# Altium schematic symbol library jlcpcb_2025_04_resistors_extended_1210.schlib: 2670 symbols (part 8 of 14) (continued)
## CR1210J91R0P05Z
designator R?  Resistance: 91Ω  (hidden comment: *)
Resistor, 91Ω, ±5%, 500mW, 200V, ±100ppm/℃, -55℃~+155℃, SMD 1210; Manufacturer: Uniroyal; Manufacturer Part Number: CR1210J91R0P05Z; Supplier 1: LCSC; Supplier Part Number 1: C174605; JLCPCB Part Number: C174605; Power Rating: 500mW; Category: Resistors; Package Size: 1210; JLCPCB Basic Part: Yes; Tolerance: ±5%; Voltage Rating: 200V; Temperature Coefficient: ±100ppm/℃; Temperature Rating: -55℃~+155℃; ComponentLink1Description: Datasheet; ComponentLink1URL: https://wmsc.lcsc.com/wmsc/upload/file/pdf/v2/lcsc/2304140030_Ever-Ohms-Tech-CR1210J91R0P05Z_C174605.pdf; ComponentLink2Description: JLCPCB Part URL; ComponentLink2URL: https://jlcpcb.com/partdetail/C174605
pins: 1, 2
1 alternate drawing of the same symbol

## CR1210J100KP05Z
designator R?  Resistance: 100kΩ  (hidden comment: *)
Resistor, 100kΩ, ±5%, 500mW, 200V, ±100ppm/℃, -55℃~+155℃, SMD 1210; Manufacturer: Uniroyal; Manufacturer Part Number: CR1210J100KP05Z; Supplier 1: LCSC; Supplier Part Number 1: C149727; JLCPCB Part Number: C149727; Power Rating: 500mW; Category: Resistors; Package Size: 1210; JLCPCB Basic Part: Yes; Tolerance: ±5%; Voltage Rating: 200V; Temperature Coefficient: ±100ppm/℃; Temperature Rating: -55℃~+155℃; ComponentLink1Description: Datasheet; ComponentLink1URL: https://wmsc.lcsc.com/wmsc/upload/file/pdf/v2/lcsc/2304140030_Ever-Ohms-Tech-CR1210J100KP05Z_C149727.pdf; ComponentLink2Description: JLCPCB Part URL; ComponentLink2URL: https://jlcpcb.com/partdetail/C149727
pins: 1, 2
1 alternate drawing of the same symbol

## CR1210J100RP05Z
designator R?  Resistance: 100Ω  (hidden comment: *)
Resistor, 100Ω, ±5%, 500mW, 200V, ±100ppm/℃, -55℃~+155℃, SMD 1210; Manufacturer: Uniroyal; Manufacturer Part Number: CR1210J100RP05Z; Supplier 1: LCSC; Supplier Part Number 1: C174606; JLCPCB Part Number: C174606; Power Rating: 500mW; Category: Resistors; Package Size: 1210; JLCPCB Basic Part: Yes; Tolerance: ±5%; Voltage Rating: 200V; Temperature Coefficient: ±100ppm/℃; Temperature Rating: -55℃~+155℃; ComponentLink1Description: Datasheet; ComponentLink1URL: https://wmsc.lcsc.com/wmsc/upload/file/pdf/v2/lcsc/2304140030_Ever-Ohms-Tech-CR1210J100RP05Z_C174606.pdf; ComponentLink2Description: JLCPCB Part URL; ComponentLink2URL: https://jlcpcb.com/partdetail/C174606
pins: 1, 2
1 alternate drawing of the same symbol

## CR1210J110KP05Z
designator R?  Resistance: 110kΩ  (hidden comment: *)
Resistor, 110kΩ, ±5%, 500mW, 200V, ±100ppm/℃, -55℃~+155℃, SMD 1210; Manufacturer: Uniroyal; Manufacturer Part Number: CR1210J110KP05Z; Supplier 1: LCSC; Supplier Part Number 1: C174659; JLCPCB Part Number: C174659; Power Rating: 500mW; Category: Resistors; Package Size: 1210; JLCPCB Basic Part: Yes; Tolerance: ±5%; Voltage Rating: 200V; Temperature Coefficient: ±100ppm/℃; Temperature Rating: -55℃~+155℃; ComponentLink1Description: Datasheet; ComponentLink1URL: https://wmsc.lcsc.com/wmsc/upload/file/pdf/v2/lcsc/2304140030_Ever-Ohms-Tech-CR1210J110KP05Z_C174659.pdf; ComponentLink2Description: JLCPCB Part URL; ComponentLink2URL: https://jlcpcb.com/partdetail/C174659
pins: 1, 2
1 alternate drawing of the same symbol

## CR1210J120KP05Z
designator R?  Resistance: 120kΩ  (hidden comment: *)
Resistor, 120kΩ, ±5%, 500mW, 200V, ±100ppm/℃, -55℃~+155℃, SMD 1210; Manufacturer: Uniroyal; Manufacturer Part Number: CR1210J120KP05Z; Supplier 1: LCSC; Supplier Part Number 1: C149731; JLCPCB Part Number: C149731; Power Rating: 500mW; Category: Resistors; Package Size: 1210; JLCPCB Basic Part: Yes; Tolerance: ±5%; Voltage Rating: 200V; Temperature Coefficient: ±100ppm/℃; Temperature Rating: -55℃~+155℃; ComponentLink1Description: Datasheet; ComponentLink1URL: https://wmsc.lcsc.com/wmsc/upload/file/pdf/v2/lcsc/2304140030_Ever-Ohms-Tech-CR1210J120KP05Z_C149731.pdf; ComponentLink2Description: JLCPCB Part URL; ComponentLink2URL: https://jlcpcb.com/partdetail/C149731
pins: 1, 2
1 alternate drawing of the same symbol

## CR1210J120RP05Z
designator R?  Resistance: 120Ω  (hidden comment: *)
Resistor, 120Ω, ±5%, 500mW, 200V, ±100ppm/℃, -55℃~+155℃, SMD 1210; Manufacturer: Uniroyal; Manufacturer Part Number: CR1210J120RP05Z; Supplier 1: LCSC; Supplier Part Number 1: C174609; JLCPCB Part Number: C174609; Power Rating: 500mW; Category: Resistors; Package Size: 1210; JLCPCB Basic Part: Yes; Tolerance: ±5%; Voltage Rating: 200V; Temperature Coefficient: ±100ppm/℃; Temperature Rating: -55℃~+155℃; ComponentLink1Description: Datasheet; ComponentLink1URL: https://wmsc.lcsc.com/wmsc/upload/file/pdf/v2/lcsc/2304140030_Ever-Ohms-Tech-CR1210J120RP05Z_C174609.pdf; ComponentLink2Description: JLCPCB Part URL; ComponentLink2URL: https://jlcpcb.com/partdetail/C174609
pins: 1, 2
1 alternate drawing of the same symbol

## CR1210J150KP05Z
designator R?  Resistance: 150kΩ  (hidden comment: *)
Resistor, 150kΩ, ±5%, 500mW, 200V, ±100ppm/℃, -55℃~+155℃, SMD 1210; Manufacturer: Uniroyal; Manufacturer Part Number: CR1210J150KP05Z; Supplier 1: LCSC; Supplier Part Number 1: C174661; JLCPCB Part Number: C174661; Power Rating: 500mW; Category: Resistors; Package Size: 1210; JLCPCB Basic Part: Yes; Tolerance: ±5%; Voltage Rating: 200V; Temperature Coefficient: ±100ppm/℃; Temperature Rating: -55℃~+155℃; ComponentLink1Description: Datasheet; ComponentLink1URL: https://wmsc.lcsc.com/wmsc/upload/file/pdf/v2/lcsc/2304140030_Ever-Ohms-Tech-CR1210J150KP05Z_C174661.pdf; ComponentLink2Description: JLCPCB Part URL; ComponentLink2URL: https://jlcpcb.com/partdetail/C174661
pins: 1, 2
1 alternate drawing of the same symbol

## CR1210J160KP05Z
designator R?  Resistance: 160kΩ  (hidden comment: *)
Resistor, 160kΩ, ±5%, 500mW, 200V, ±100ppm/℃, -55℃~+155℃, SMD 1210; Manufacturer: Uniroyal; Manufacturer Part Number: CR1210J160KP05Z; Supplier 1: LCSC; Supplier Part Number 1: C174662; JLCPCB Part Number: C174662; Power Rating: 500mW; Category: Resistors; Package Size: 1210; JLCPCB Basic Part: Yes; Tolerance: ±5%; Voltage Rating: 200V; Temperature Coefficient: ±100ppm/℃; Temperature Rating: -55℃~+155℃; ComponentLink1Description: Datasheet; ComponentLink1URL: https://wmsc.lcsc.com/wmsc/upload/file/pdf/v2/lcsc/2304140030_Ever-Ohms-Tech-CR1210J160KP05Z_C174662.pdf; ComponentLink2Description: JLCPCB Part URL; ComponentLink2URL: https://jlcpcb.com/partdetail/C174662
pins: 1, 2
1 alternate drawing of the same symbol

## CR1210J160RP05Z
designator R?  Resistance: 160Ω  (hidden comment: *)
Resistor, 160Ω, ±5%, 500mW, 200V, ±100ppm/℃, -55℃~+155℃, SMD 1210; Manufacturer: Uniroyal; Manufacturer Part Number: CR1210J160RP05Z; Supplier 1: LCSC; Supplier Part Number 1: C174612; JLCPCB Part Number: C174612; Power Rating: 500mW; Category: Resistors; Package Size: 1210; JLCPCB Basic Part: Yes; Tolerance: ±5%; Voltage Rating: 200V; Temperature Coefficient: ±100ppm/℃; Temperature Rating: -55℃~+155℃; ComponentLink1Description: Datasheet; ComponentLink1URL: https://wmsc.lcsc.com/wmsc/upload/file/pdf/v2/lcsc/2304140030_Ever-Ohms-Tech-CR1210J160RP05Z_C174612.pdf; ComponentLink2Description: JLCPCB Part URL; ComponentLink2URL: https://jlcpcb.com/partdetail/C174612
pins: 1, 2
1 alternate drawing of the same symbol

## CR1210J180KP05Z
designator R?  Resistance: 180kΩ  (hidden comment: *)
Resistor, 180kΩ, ±5%, 500mW, 200V, ±100ppm/℃, -55℃~+155℃, SMD 1210; Manufacturer: Uniroyal; Manufacturer Part Number: CR1210J180KP05Z; Supplier 1: LCSC; Supplier Part Number 1: C149736; JLCPCB Part Number: C149736; Power Rating: 500mW; Category: Resistors; Package Size: 1210; JLCPCB Basic Part: Yes; Tolerance: ±5%; Voltage Rating: 200V; Temperature Coefficient: ±100ppm/℃; Temperature Rating: -55℃~+155℃; ComponentLink1Description: Datasheet; ComponentLink1URL: https://wmsc.lcsc.com/wmsc/upload/file/pdf/v2/lcsc/2304140030_Ever-Ohms-Tech-CR1210J180KP05Z_C149736.pdf; ComponentLink2Description: JLCPCB Part URL; ComponentLink2URL: https://jlcpcb.com/partdetail/C149736
pins: 1, 2
1 alternate drawing of the same symbol

## CR1210J180RP05Z
designator R?  Resistance: 180Ω  (hidden comment: *)
Resistor, 180Ω, ±5%, 500mW, 200V, ±100ppm/℃, -55℃~+155℃, SMD 1210; Manufacturer: Uniroyal; Manufacturer Part Number: CR1210J180RP05Z; Supplier 1: LCSC; Supplier Part Number 1: C149737; JLCPCB Part Number: C149737; Power Rating: 500mW; Category: Resistors; Package Size: 1210; JLCPCB Basic Part: Yes; Tolerance: ±5%; Voltage Rating: 200V; Temperature Coefficient: ±100ppm/℃; Temperature Rating: -55℃~+155℃; ComponentLink1Description: Datasheet; ComponentLink1URL: https://wmsc.lcsc.com/wmsc/upload/file/pdf/v2/lcsc/2304140030_Ever-Ohms-Tech-CR1210J180RP05Z_C149737.pdf; ComponentLink2Description: JLCPCB Part URL; ComponentLink2URL: https://jlcpcb.com/partdetail/C149737
pins: 1, 2
1 alternate drawing of the same symbol

## CR1210J200KP05Z
designator R?  Resistance: 200kΩ  (hidden comment: *)
Resistor, 200kΩ, ±5%, 500mW, 200V, ±100ppm/℃, -55℃~+155℃, SMD 1210; Manufacturer: Uniroyal; Manufacturer Part Number: CR1210J200KP05Z; Supplier 1: LCSC; Supplier Part Number 1: C174664; JLCPCB Part Number: C174664; Power Rating: 500mW; Category: Resistors; Package Size: 1210; JLCPCB Basic Part: Yes; Tolerance: ±5%; Voltage Rating: 200V; Temperature Coefficient: ±100ppm/℃; Temperature Rating: -55℃~+155℃; ComponentLink1Description: Datasheet; ComponentLink1URL: https://wmsc.lcsc.com/wmsc/upload/file/pdf/v2/lcsc/2304140030_Ever-Ohms-Tech-CR1210J200KP05Z_C174664.pdf; ComponentLink2Description: JLCPCB Part URL; ComponentLink2URL: https://jlcpcb.com/partdetail/C174664
pins: 1, 2
1 alternate drawing of the same symbol

## CR1210J200RP05Z
designator R?  Resistance: 200Ω  (hidden comment: *)
Resistor, 200Ω, ±5%, 500mW, 200V, ±100ppm/℃, -55℃~+155℃, SMD 1210; Manufacturer: Uniroyal; Manufacturer Part Number: CR1210J200RP05Z; Supplier 1: LCSC; Supplier Part Number 1: C174613; JLCPCB Part Number: C174613; Power Rating: 500mW; Category: Resistors; Package Size: 1210; JLCPCB Basic Part: Yes; Tolerance: ±5%; Voltage Rating: 200V; Temperature Coefficient: ±100ppm/℃; Temperature Rating: -55℃~+155℃; ComponentLink1Description: Datasheet; ComponentLink1URL: https://wmsc.lcsc.com/wmsc/upload/file/pdf/v2/lcsc/2304140030_Ever-Ohms-Tech-CR1210J200RP05Z_C174613.pdf; ComponentLink2Description: JLCPCB Part URL; ComponentLink2URL: https://jlcpcb.com/partdetail/C174613
pins: 1, 2
1 alternate drawing of the same symbol

## CR1210J220KP05Z
designator R?  Resistance: 220kΩ  (hidden comment: *)
Resistor, 220kΩ, ±5%, 500mW, 200V, ±100ppm/℃, -55℃~+155℃, SMD 1210; Manufacturer: Uniroyal; Manufacturer Part Number: CR1210J220KP05Z; Supplier 1: LCSC; Supplier Part Number 1: C149753; JLCPCB Part Number: C149753; Power Rating: 500mW; Category: Resistors; Package Size: 1210; JLCPCB Basic Part: Yes; Tolerance: ±5%; Voltage Rating: 200V; Temperature Coefficient: ±100ppm/℃; Temperature Rating: -55℃~+155℃; ComponentLink1Description: Datasheet; ComponentLink1URL: https://wmsc.lcsc.com/wmsc/upload/file/pdf/v2/lcsc/2304140030_Ever-Ohms-Tech-CR1210J220KP05Z_C149753.pdf; ComponentLink2Description: JLCPCB Part URL; ComponentLink2URL: https://jlcpcb.com/partdetail/C149753
pins: 1, 2
1 alternate drawing of the same symbol

## CR1210J220RP05Z
designator R?  Resistance: 220Ω  (hidden comment: *)
Resistor, 220Ω, ±5%, 500mW, 200V, ±100ppm/℃, -55℃~+155℃, SMD 1210; Manufacturer: Uniroyal; Manufacturer Part Number: CR1210J220RP05Z; Supplier 1: LCSC; Supplier Part Number 1: C149754; JLCPCB Part Number: C149754; Power Rating: 500mW; Category: Resistors; Package Size: 1210; JLCPCB Basic Part: Yes; Tolerance: ±5%; Voltage Rating: 200V; Temperature Coefficient: ±100ppm/℃; Temperature Rating: -55℃~+155℃; ComponentLink1Description: Datasheet; ComponentLink1URL: https://wmsc.lcsc.com/wmsc/upload/file/pdf/v2/lcsc/2304140030_Ever-Ohms-Tech-CR1210J220RP05Z_C149754.pdf; ComponentLink2Description: JLCPCB Part URL; ComponentLink2URL: https://jlcpcb.com/partdetail/C149754
pins: 1, 2
1 alternate drawing of the same symbol

## CR1210J240RP05Z
designator R?  Resistance: 240Ω  (hidden comment: *)
Resistor, 240Ω, ±5%, 500mW, 200V, ±100ppm/℃, -55℃~+155℃, SMD 1210; Manufacturer: Uniroyal; Manufacturer Part Number: CR1210J240RP05Z; Supplier 1: LCSC; Supplier Part Number 1: C149756; JLCPCB Part Number: C149756; Power Rating: 500mW; Category: Resistors; Package Size: 1210; JLCPCB Basic Part: Yes; Tolerance: ±5%; Voltage Rating: 200V; Temperature Coefficient: ±100ppm/℃; Temperature Rating: -55℃~+155℃; ComponentLink1Description: Datasheet; ComponentLink1URL: https://wmsc.lcsc.com/wmsc/upload/file/pdf/v2/lcsc/2304140030_Ever-Ohms-Tech-CR1210J240RP05Z_C149756.pdf; ComponentLink2Description: JLCPCB Part URL; ComponentLink2URL: https://jlcpcb.com/partdetail/C149756
pins: 1, 2
1 alternate drawing of the same symbol

## CR1210J270RP05Z
designator R?  Resistance: 270Ω  (hidden comment: *)
Resistor, 270Ω, ±5%, 500mW, 200V, ±100ppm/℃, -55℃~+155℃, SMD 1210; Manufacturer: Uniroyal; Manufacturer Part Number: CR1210J270RP05Z; Supplier 1: LCSC; Supplier Part Number 1: C149759; JLCPCB Part Number: C149759; Power Rating: 500mW; Category: Resistors; Package Size: 1210; JLCPCB Basic Part: Yes; Tolerance: ±5%; Voltage Rating: 200V; Temperature Coefficient: ±100ppm/℃; Temperature Rating: -55℃~+155℃; ComponentLink1Description: Datasheet; ComponentLink1URL: https://wmsc.lcsc.com/wmsc/upload/file/pdf/v2/lcsc/2304140030_Ever-Ohms-Tech-CR1210J270RP05Z_C149759.pdf; ComponentLink2Description: JLCPCB Part URL; ComponentLink2URL: https://jlcpcb.com/partdetail/C149759
pins: 1, 2
1 alternate drawing of the same symbol

## CR1210J300RP05Z
designator R?  Resistance: 300Ω  (hidden comment: *)
Resistor, 300Ω, ±5%, 500mW, 200V, ±100ppm/℃, -55℃~+155℃, SMD 1210; Manufacturer: Uniroyal; Manufacturer Part Number: CR1210J300RP05Z; Supplier 1: LCSC; Supplier Part Number 1: C174614; JLCPCB Part Number: C174614; Power Rating: 500mW; Category: Resistors; Package Size: 1210; JLCPCB Basic Part: Yes; Tolerance: ±5%; Voltage Rating: 200V; Temperature Coefficient: ±100ppm/℃; Temperature Rating: -55℃~+155℃; ComponentLink1Description: Datasheet; ComponentLink1URL: https://wmsc.lcsc.com/wmsc/upload/file/pdf/v2/lcsc/2304140030_Ever-Ohms-Tech-CR1210J300RP05Z_C174614.pdf; ComponentLink2Description: JLCPCB Part URL; ComponentLink2URL: https://jlcpcb.com/partdetail/C174614
pins: 1, 2
1 alternate drawing of the same symbol

## CR1210J301R2G
designator R?  Resistance: 1.2Ω  (hidden comment: *)
Resistor, 1.2Ω, ±5%, 750mW, 200V, -250ppm/℃~+500ppm/℃, -55℃~+125℃, SMD 1210; Manufacturer: Uniroyal; Manufacturer Part Number: CR1210J301R2G; Supplier 1: LCSC; Supplier Part Number 1: C102422; JLCPCB Part Number: C102422; Power Rating: 750mW; Category: Resistors; Package Size: 1210; JLCPCB Basic Part: Yes; Tolerance: ±5%; Voltage Rating: 200V; Temperature Coefficient: -250ppm/℃~+500ppm/℃; Temperature Rating: -55℃~+125℃; ComponentLink1Description: Datasheet; ComponentLink1URL: https://wmsc.lcsc.com/wmsc/upload/file/pdf/v2/lcsc/2304140030_LIZ-Elec-CR1210J301R2G_C102422.pdf; ComponentLink2Description: JLCPCB Part URL; ComponentLink2URL: https://jlcpcb.com/partdetail/C102422
pins: 1, 2
1 alternate drawing of the same symbol

## CR1210J301R5G
designator R?  Resistance: 1.5Ω  (hidden comment: *)
Resistor, 1.5Ω, ±5%, 750mW, 200V, -250ppm/℃~+500ppm/℃, -55℃~+125℃, SMD 1210; Manufacturer: Uniroyal; Manufacturer Part Number: CR1210J301R5G; Supplier 1: LCSC; Supplier Part Number 1: C102423; JLCPCB Part Number: C102423; Power Rating: 750mW; Category: Resistors; Package Size: 1210; JLCPCB Basic Part: Yes; Tolerance: ±5%; Voltage Rating: 200V; Temperature Coefficient: -250ppm/℃~+500ppm/℃; Temperature Rating: -55℃~+125℃; ComponentLink1Description: Datasheet; ComponentLink1URL: https://wmsc.lcsc.com/wmsc/upload/file/pdf/v2/lcsc/2304140030_LIZ-Elec-CR1210J301R5G_C102423.pdf; ComponentLink2Description: JLCPCB Part URL; ComponentLink2URL: https://jlcpcb.com/partdetail/C102423
pins: 1, 2
1 alternate drawing of the same symbol

## CR1210J301R6G
designator R?  Resistance: 1.6Ω  (hidden comment: *)
Resistor, 1.6Ω, ±5%, 750mW, 200V, -250ppm/℃~+500ppm/℃, -55℃~+125℃, SMD 1210; Manufacturer: Uniroyal; Manufacturer Part Number: CR1210J301R6G; Supplier 1: LCSC; Supplier Part Number 1: C102424; JLCPCB Part Number: C102424; Power Rating: 750mW; Category: Resistors; Package Size: 1210; JLCPCB Basic Part: Yes; Tolerance: ±5%; Voltage Rating: 200V; Temperature Coefficient: -250ppm/℃~+500ppm/℃; Temperature Rating: -55℃~+125℃; ComponentLink1Description: Datasheet; ComponentLink1URL: https://wmsc.lcsc.com/wmsc/upload/file/pdf/v2/lcsc/2304140030_LIZ-Elec-CR1210J301R6G_C102424.pdf; ComponentLink2Description: JLCPCB Part URL; ComponentLink2URL: https://jlcpcb.com/partdetail/C102424
pins: 1, 2
1 alternate drawing of the same symbol

## CR1210J301R8G
designator R?  Resistance: 1.8Ω  (hidden comment: *)
Resistor, 1.8Ω, ±5%, 750mW, 200V, -250ppm/℃~+500ppm/℃, -55℃~+125℃, SMD 1210; Manufacturer: Uniroyal; Manufacturer Part Number: CR1210J301R8G; Supplier 1: LCSC; Supplier Part Number 1: C102425; JLCPCB Part Number: C102425; Power Rating: 750mW; Category: Resistors; Package Size: 1210; JLCPCB Basic Part: Yes; Tolerance: ±5%; Voltage Rating: 200V; Temperature Coefficient: -250ppm/℃~+500ppm/℃; Temperature Rating: -55℃~+125℃; ComponentLink1Description: Datasheet; ComponentLink1URL: https://wmsc.lcsc.com/wmsc/upload/file/pdf/v2/lcsc/2304140030_LIZ-Elec-CR1210J301R8G_C102425.pdf; ComponentLink2Description: JLCPCB Part URL; ComponentLink2URL: https://jlcpcb.com/partdetail/C102425
pins: 1, 2
1 alternate drawing of the same symbol

## CR1210J302R0G
designator R?  Resistance: 2Ω  (hidden comment: *)
Resistor, 2Ω, ±5%, 750mW, 200V, -250ppm/℃~+500ppm/℃, -55℃~+125℃, SMD 1210; Manufacturer: Uniroyal; Manufacturer Part Number: CR1210J302R0G; Supplier 1: LCSC; Supplier Part Number 1: C102447; JLCPCB Part Number: C102447; Power Rating: 750mW; Category: Resistors; Package Size: 1210; JLCPCB Basic Part: Yes; Tolerance: ±5%; Voltage Rating: 200V; Temperature Coefficient: -250ppm/℃~+500ppm/℃; Temperature Rating: -55℃~+125℃; ComponentLink1Description: Datasheet; ComponentLink1URL: https://wmsc.lcsc.com/wmsc/upload/file/pdf/v2/lcsc/2304140030_LIZ-Elec-CR1210J302R0G_C102447.pdf; ComponentLink2Description: JLCPCB Part URL; ComponentLink2URL: https://jlcpcb.com/partdetail/C102447
pins: 1, 2
1 alternate drawing of the same symbol

## CR1210J302R2G
designator R?  Resistance: 2.2Ω  (hidden comment: *)
Resistor, 2.2Ω, ±5%, 750mW, 200V, -250ppm/℃~+500ppm/℃, -55℃~+125℃, SMD 1210; Manufacturer: Uniroyal; Manufacturer Part Number: CR1210J302R2G; Supplier 1: LCSC; Supplier Part Number 1: C102448; JLCPCB Part Number: C102448; Power Rating: 750mW; Category: Resistors; Package Size: 1210; JLCPCB Basic Part: Yes; Tolerance: ±5%; Voltage Rating: 200V; Temperature Coefficient: -250ppm/℃~+500ppm/℃; Temperature Rating: -55℃~+125℃; ComponentLink1Description: Datasheet; ComponentLink1URL: https://wmsc.lcsc.com/wmsc/upload/file/pdf/v2/lcsc/2304140030_LIZ-Elec-CR1210J302R2G_C102448.pdf; ComponentLink2Description: JLCPCB Part URL; ComponentLink2URL: https://jlcpcb.com/partdetail/C102448
pins: 1, 2
1 alternate drawing of the same symbol

## CR1210J303R3G
designator R?  Resistance: 3.3Ω  (hidden comment: *)
Resistor, 3.3Ω, ±5%, 750mW, 200V, -250ppm/℃~+500ppm/℃, -55℃~+125℃, SMD 1210; Manufacturer: Uniroyal; Manufacturer Part Number: CR1210J303R3G; Supplier 1: LCSC; Supplier Part Number 1: C102467; JLCPCB Part Number: C102467; Power Rating: 750mW; Category: Resistors; Package Size: 1210; JLCPCB Basic Part: Yes; Tolerance: ±5%; Voltage Rating: 200V; Temperature Coefficient: -250ppm/℃~+500ppm/℃; Temperature Rating: -55℃~+125℃; ComponentLink1Description: Datasheet; ComponentLink1URL: https://wmsc.lcsc.com/wmsc/upload/file/pdf/v2/lcsc/2304140030_LIZ-Elec-CR1210J303R3G_C102467.pdf; ComponentLink2Description: JLCPCB Part URL; ComponentLink2URL: https://jlcpcb.com/partdetail/C102467
pins: 1, 2
1 alternate drawing of the same symbol

## CR1210J303R6G
designator R?  Resistance: 3.6Ω  (hidden comment: *)
Resistor, 3.6Ω, ±5%, 200V, SMD 1210; Manufacturer: Uniroyal; Manufacturer Part Number: CR1210J303R6G; Supplier 1: LCSC; Supplier Part Number 1: C3037120; JLCPCB Part Number: C3037120; Category: Resistors; Package Size: 1210; JLCPCB Basic Part: Yes; Tolerance: ±5%; Voltage Rating: 200V; ComponentLink1Description: Datasheet; ComponentLink1URL: https://wmsc.lcsc.com/wmsc/upload/file/pdf/v2/lcsc/2206222045_LIZ-Elec-CR1210J303R6G_C3037120.pdf; ComponentLink2Description: JLCPCB Part URL; ComponentLink2URL: https://jlcpcb.com/partdetail/C3037120
pins: 1, 2
1 alternate drawing of the same symbol

## CR1210J304R3G
designator R?  Resistance: 4.3Ω  (hidden comment: *)
Resistor, 4.3Ω, ±5%, 750mW, 200V, -250ppm/℃~+500ppm/℃, -55℃~+125℃, SMD 1210; Manufacturer: Uniroyal; Manufacturer Part Number: CR1210J304R3G; Supplier 1: LCSC; Supplier Part Number 1: C102477; JLCPCB Part Number: C102477; Power Rating: 750mW; Category: Resistors; Package Size: 1210; JLCPCB Basic Part: Yes; Tolerance: ±5%; Voltage Rating: 200V; Temperature Coefficient: -250ppm/℃~+500ppm/℃; Temperature Rating: -55℃~+125℃; ComponentLink1Description: Datasheet; ComponentLink1URL: https://wmsc.lcsc.com/wmsc/upload/file/pdf/v2/lcsc/2304140030_LIZ-Elec-CR1210J304R3G_C102477.pdf; ComponentLink2Description: JLCPCB Part URL; ComponentLink2URL: https://jlcpcb.com/partdetail/C102477
pins: 1, 2
1 alternate drawing of the same symbol

## CR1210J307R5G
designator R?  Resistance: 7.5Ω  (hidden comment: *)
Resistor, 7.5Ω, ±5%, 750mW, 200V, -250ppm/℃~+500ppm/℃, -55℃~+125℃, SMD 1210; Manufacturer: Uniroyal; Manufacturer Part Number: CR1210J307R5G; Supplier 1: LCSC; Supplier Part Number 1: C102501; JLCPCB Part Number: C102501; Power Rating: 750mW; Category: Resistors; Package Size: 1210; JLCPCB Basic Part: Yes; Tolerance: ±5%; Voltage Rating: 200V; Temperature Coefficient: -250ppm/℃~+500ppm/℃; Temperature Rating: -55℃~+125℃; ComponentLink1Description: Datasheet; ComponentLink1URL: https://wmsc.lcsc.com/wmsc/upload/file/pdf/v2/lcsc/2304140030_LIZ-Elec-CR1210J307R5G_C102501.pdf; ComponentLink2Description: JLCPCB Part URL; ComponentLink2URL: https://jlcpcb.com/partdetail/C102501
pins: 1, 2
1 alternate drawing of the same symbol

## CR1210J309R1G
designator R?  Resistance: 9.1Ω  (hidden comment: *)
Resistor, 9.1Ω, ±5%, 200V, SMD 1210; Manufacturer: Uniroyal; Manufacturer Part Number: CR1210J309R1G; Supplier 1: LCSC; Supplier Part Number 1: C3037412; JLCPCB Part Number: C3037412; Category: Resistors; Package Size: 1210; JLCPCB Basic Part: Yes; Tolerance: ±5%; Voltage Rating: 200V; ComponentLink1Description: Datasheet; ComponentLink1URL: https://wmsc.lcsc.com/wmsc/upload/file/pdf/v2/lcsc/2206222045_LIZ-Elec-CR1210J309R1G_C3037412.pdf; ComponentLink2Description: JLCPCB Part URL; ComponentLink2URL: https://jlcpcb.com/partdetail/C3037412
pins: 1, 2
1 alternate drawing of the same symbol

## CR1210J330KP05Z
designator R?  Resistance: 330kΩ  (hidden comment: *)
Resistor, 330kΩ, ±5%, 500mW, 200V, ±100ppm/℃, -55℃~+155℃, SMD 1210; Manufacturer: Uniroyal; Manufacturer Part Number: CR1210J330KP05Z; Supplier 1: LCSC; Supplier Part Number 1: C149770; JLCPCB Part Number: C149770; Power Rating: 500mW; Category: Resistors; Package Size: 1210; JLCPCB Basic Part: Yes; Tolerance: ±5%; Voltage Rating: 200V; Temperature Coefficient: ±100ppm/℃; Temperature Rating: -55℃~+155℃; ComponentLink1Description: Datasheet; ComponentLink1URL: https://wmsc.lcsc.com/wmsc/upload/file/pdf/v2/lcsc/2304140030_Ever-Ohms-Tech-CR1210J330KP05Z_C149770.pdf; ComponentLink2Description: JLCPCB Part URL; ComponentLink2URL: https://jlcpcb.com/partdetail/C149770
pins: 1, 2
1 alternate drawing of the same symbol

## CR1210J330RP05Z
designator R?  Resistance: 330Ω  (hidden comment: *)
Resistor, 330Ω, ±5%, 500mW, 200V, ±100ppm/℃, -55℃~+155℃, SMD 1210; Manufacturer: Uniroyal; Manufacturer Part Number: CR1210J330RP05Z; Supplier 1: LCSC; Supplier Part Number 1: C149771; JLCPCB Part Number: C149771; Power Rating: 500mW; Category: Resistors; Package Size: 1210; JLCPCB Basic Part: Yes; Tolerance: ±5%; Voltage Rating: 200V; Temperature Coefficient: ±100ppm/℃; Temperature Rating: -55℃~+155℃; ComponentLink1Description: Datasheet; ComponentLink1URL: https://wmsc.lcsc.com/wmsc/upload/file/pdf/v2/lcsc/2304140030_Ever-Ohms-Tech-CR1210J330RP05Z_C149771.pdf; ComponentLink2Description: JLCPCB Part URL; ComponentLink2URL: https://jlcpcb.com/partdetail/C149771
pins: 1, 2
1 alternate drawing of the same symbol

## CR1210J360KP05Z
designator R?  Resistance: 360kΩ  (hidden comment: *)
Resistor, 360kΩ, ±5%, 500mW, 200V, ±100ppm/℃, -55℃~+155℃, SMD 1210; Manufacturer: Uniroyal; Manufacturer Part Number: CR1210J360KP05Z; Supplier 1: LCSC; Supplier Part Number 1: C149774; JLCPCB Part Number: C149774; Power Rating: 500mW; Category: Resistors; Package Size: 1210; JLCPCB Basic Part: Yes; Tolerance: ±5%; Voltage Rating: 200V; Temperature Coefficient: ±100ppm/℃; Temperature Rating: -55℃~+155℃; ComponentLink1Description: Datasheet; ComponentLink1URL: https://wmsc.lcsc.com/wmsc/upload/file/pdf/v2/lcsc/2304140030_Ever-Ohms-Tech-CR1210J360KP05Z_C149774.pdf; ComponentLink2Description: JLCPCB Part URL; ComponentLink2URL: https://jlcpcb.com/partdetail/C149774
pins: 1, 2
1 alternate drawing of the same symbol

## CR1210J390RP05Z
designator R?  Resistance: 390Ω  (hidden comment: *)
Resistor, 390Ω, ±5%, 500mW, 200V, ±100ppm/℃, -55℃~+155℃, SMD 1210; Manufacturer: Uniroyal; Manufacturer Part Number: CR1210J390RP05Z; Supplier 1: LCSC; Supplier Part Number 1: C149777; JLCPCB Part Number: C149777; Power Rating: 500mW; Category: Resistors; Package Size: 1210; JLCPCB Basic Part: Yes; Tolerance: ±5%; Voltage Rating: 200V; Temperature Coefficient: ±100ppm/℃; Temperature Rating: -55℃~+155℃; ComponentLink1Description: Datasheet; ComponentLink1URL: https://wmsc.lcsc.com/wmsc/upload/file/pdf/v2/lcsc/2304140030_Ever-Ohms-Tech-CR1210J390RP05Z_C149777.pdf; ComponentLink2Description: JLCPCB Part URL; ComponentLink2URL: https://jlcpcb.com/partdetail/C149777
pins: 1, 2
1 alternate drawing of the same symbol

## CR1210J430KP05Z
designator R?  Resistance: 430kΩ  (hidden comment: *)
Resistor, 430kΩ, ±5%, 500mW, 200V, ±100ppm/℃, -55℃~+155℃, SMD 1210; Manufacturer: Uniroyal; Manufacturer Part Number: CR1210J430KP05Z; Supplier 1: LCSC; Supplier Part Number 1: C174668; JLCPCB Part Number: C174668; Power Rating: 500mW; Category: Resistors; Package Size: 1210; JLCPCB Basic Part: Yes; Tolerance: ±5%; Voltage Rating: 200V; Temperature Coefficient: ±100ppm/℃; Temperature Rating: -55℃~+155℃; ComponentLink1Description: Datasheet; ComponentLink1URL: https://wmsc.lcsc.com/wmsc/upload/file/pdf/v2/lcsc/2304140030_Ever-Ohms-Tech-CR1210J430KP05Z_C174668.pdf; ComponentLink2Description: JLCPCB Part URL; ComponentLink2URL: https://jlcpcb.com/partdetail/C174668
pins: 1, 2
1 alternate drawing of the same symbol

## CR1210J430RP05Z
designator R?  Resistance: 430Ω  (hidden comment: *)
Resistor, 430Ω, ±5%, 500mW, 200V, ±100ppm/℃, -55℃~+155℃, SMD 1210; Manufacturer: Uniroyal; Manufacturer Part Number: CR1210J430RP05Z; Supplier 1: LCSC; Supplier Part Number 1: C174615; JLCPCB Part Number: C174615; Power Rating: 500mW; Category: Resistors; Package Size: 1210; JLCPCB Basic Part: Yes; Tolerance: ±5%; Voltage Rating: 200V; Temperature Coefficient: ±100ppm/℃; Temperature Rating: -55℃~+155℃; ComponentLink1Description: Datasheet; ComponentLink1URL: https://wmsc.lcsc.com/wmsc/upload/file/pdf/v2/lcsc/2304140030_Ever-Ohms-Tech-CR1210J430RP05Z_C174615.pdf; ComponentLink2Description: JLCPCB Part URL; ComponentLink2URL: https://jlcpcb.com/partdetail/C174615
pins: 1, 2
1 alternate drawing of the same symbol

## CR1210J470KP05Z
designator R?  Resistance: 470kΩ  (hidden comment: *)
Resistor, 470kΩ, ±5%, 500mW, 200V, ±100ppm/℃, -55℃~+155℃, SMD 1210; Manufacturer: Uniroyal; Manufacturer Part Number: CR1210J470KP05Z; Supplier 1: LCSC; Supplier Part Number 1: C149787; JLCPCB Part Number: C149787; Power Rating: 500mW; Category: Resistors; Package Size: 1210; JLCPCB Basic Part: Yes; Tolerance: ±5%; Voltage Rating: 200V; Temperature Coefficient: ±100ppm/℃; Temperature Rating: -55℃~+155℃; ComponentLink1Description: Datasheet; ComponentLink1URL: https://wmsc.lcsc.com/wmsc/upload/file/pdf/v2/lcsc/2304140030_Ever-Ohms-Tech-CR1210J470KP05Z_C149787.pdf; ComponentLink2Description: JLCPCB Part URL; ComponentLink2URL: https://jlcpcb.com/partdetail/C149787
pins: 1, 2
1 alternate drawing of the same symbol

## CR1210J510KP05
designator R?  Resistance: 510kΩ  (hidden comment: *)
Resistor, 510kΩ, ±5%, 500mW, 200V, ±200ppm/℃, -55℃~+155℃, SMD 1210; Manufacturer: Uniroyal; Manufacturer Part Number: CR1210J510KP05; Supplier 1: LCSC; Supplier Part Number 1: C429318; JLCPCB Part Number: C429318; Power Rating: 500mW; Category: Resistors; Package Size: 1210; JLCPCB Basic Part: Yes; Tolerance: ±5%; Voltage Rating: 200V; Temperature Coefficient: ±200ppm/℃; Temperature Rating: -55℃~+155℃; ComponentLink1Description: Datasheet; ComponentLink1URL: https://wmsc.lcsc.com/wmsc/upload/file/pdf/v2/lcsc/2304140030_Ever-Ohms-Tech-CR1210J510KP05_C429318.pdf; ComponentLink2Description: JLCPCB Part URL; ComponentLink2URL: https://jlcpcb.com/partdetail/C429318
pins: 1, 2
1 alternate drawing of the same symbol

## CR1210J510RP05Z
designator R?  Resistance: 510Ω  (hidden comment: *)
Resistor, 510Ω, ±5%, 500mW, 200V, ±100ppm/℃, -55℃~+155℃, SMD 1210; Manufacturer: Uniroyal; Manufacturer Part Number: CR1210J510RP05Z; Supplier 1: LCSC; Supplier Part Number 1: C174617; JLCPCB Part Number: C174617; Power Rating: 500mW; Category: Resistors; Package Size: 1210; JLCPCB Basic Part: Yes; Tolerance: ±5%; Voltage Rating: 200V; Temperature Coefficient: ±100ppm/℃; Temperature Rating: -55℃~+155℃; ComponentLink1Description: Datasheet; ComponentLink1URL: https://wmsc.lcsc.com/wmsc/upload/file/pdf/v2/lcsc/2304140030_Ever-Ohms-Tech-CR1210J510RP05Z_C174617.pdf; ComponentLink2Description: JLCPCB Part URL; ComponentLink2URL: https://jlcpcb.com/partdetail/C174617
pins: 1, 2
1 alternate drawing of the same symbol

## CR1210J560RP05Z
designator R?  Resistance: 560Ω  (hidden comment: *)
Resistor, 560Ω, ±5%, 500mW, 200V, ±100ppm/℃, -55℃~+155℃, SMD 1210; Manufacturer: Uniroyal; Manufacturer Part Number: CR1210J560RP05Z; Supplier 1: LCSC; Supplier Part Number 1: C149793; JLCPCB Part Number: C149793; Power Rating: 500mW; Category: Resistors; Package Size: 1210; JLCPCB Basic Part: Yes; Tolerance: ±5%; Voltage Rating: 200V; Temperature Coefficient: ±100ppm/℃; Temperature Rating: -55℃~+155℃; ComponentLink1Description: Datasheet; ComponentLink1URL: https://wmsc.lcsc.com/wmsc/upload/file/pdf/v2/lcsc/2304140030_Ever-Ohms-Tech-CR1210J560RP05Z_C149793.pdf; ComponentLink2Description: JLCPCB Part URL; ComponentLink2URL: https://jlcpcb.com/partdetail/C149793
pins: 1, 2
1 alternate drawing of the same symbol

## CR1210J620RP05Z
designator R?  Resistance: 620Ω  (hidden comment: *)
Resistor, 620Ω, ±5%, 500mW, 200V, ±100ppm/℃, -55℃~+155℃, SMD 1210; Manufacturer: Uniroyal; Manufacturer Part Number: CR1210J620RP05Z; Supplier 1: LCSC; Supplier Part Number 1: C174619; JLCPCB Part Number: C174619; Power Rating: 500mW; Category: Resistors; Package Size: 1210; JLCPCB Basic Part: Yes; Tolerance: ±5%; Voltage Rating: 200V; Temperature Coefficient: ±100ppm/℃; Temperature Rating: -55℃~+155℃; ComponentLink1Description: Datasheet; ComponentLink1URL: https://wmsc.lcsc.com/wmsc/upload/file/pdf/v2/lcsc/2304140030_Ever-Ohms-Tech-CR1210J620RP05Z_C174619.pdf; ComponentLink2Description: JLCPCB Part URL; ComponentLink2URL: https://jlcpcb.com/partdetail/C174619
pins: 1, 2
1 alternate drawing of the same symbol

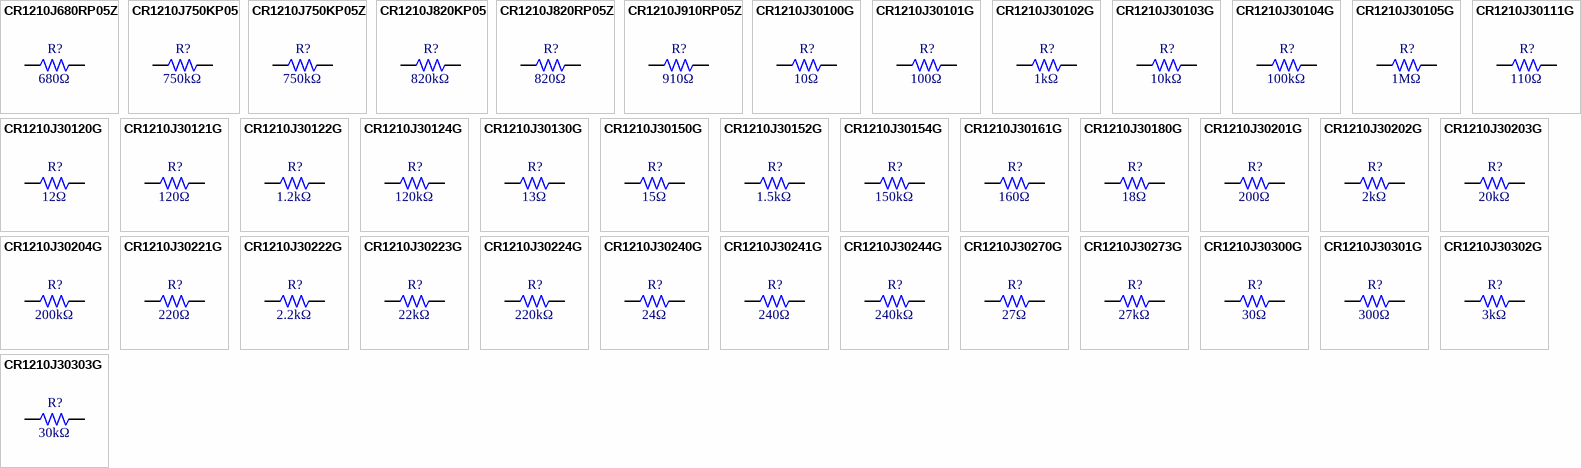
[diagram p36: symbols CR1210J680RP05Z to CR1210J30303G]

## CR1210J680RP05Z
designator R?  Resistance: 680Ω  (hidden comment: *)
Resistor, 680Ω, ±5%, 500mW, 200V, ±100ppm/℃, -55℃~+155℃, SMD 1210; Manufacturer: Uniroyal; Manufacturer Part Number: CR1210J680RP05Z; Supplier 1: LCSC; Supplier Part Number 1: C174621; JLCPCB Part Number: C174621; Power Rating: 500mW; Category: Resistors; Package Size: 1210; JLCPCB Basic Part: Yes; Tolerance: ±5%; Voltage Rating: 200V; Temperature Coefficient: ±100ppm/℃; Temperature Rating: -55℃~+155℃; ComponentLink1Description: Datasheet; ComponentLink1URL: https://wmsc.lcsc.com/wmsc/upload/file/pdf/v2/lcsc/2304140030_Ever-Ohms-Tech-CR1210J680RP05Z_C174621.pdf; ComponentLink2Description: JLCPCB Part URL; ComponentLink2URL: https://jlcpcb.com/partdetail/C174621
pins: 1, 2
1 alternate drawing of the same symbol

## CR1210J750KP05
designator R?  Resistance: 750kΩ  (hidden comment: *)
Resistor, 750kΩ, ±5%, 500mW, 200V, ±200ppm/℃, -55℃~+155℃, SMD 1210; Manufacturer: Uniroyal; Manufacturer Part Number: CR1210J750KP05; Supplier 1: LCSC; Supplier Part Number 1: C429293; JLCPCB Part Number: C429293; Power Rating: 500mW; Category: Resistors; Package Size: 1210; JLCPCB Basic Part: Yes; Tolerance: ±5%; Voltage Rating: 200V; Temperature Coefficient: ±200ppm/℃; Temperature Rating: -55℃~+155℃; ComponentLink1Description: Datasheet; ComponentLink1URL: https://wmsc.lcsc.com/wmsc/upload/file/pdf/v2/lcsc/2304140030_Ever-Ohms-Tech-CR1210J750KP05_C429293.pdf; ComponentLink2Description: JLCPCB Part URL; ComponentLink2URL: https://jlcpcb.com/partdetail/C429293
pins: 1, 2
1 alternate drawing of the same symbol

## CR1210J750KP05Z
designator R?  Resistance: 750kΩ  (hidden comment: *)
Resistor, 750kΩ, ±5%, 500mW, 200V, ±100ppm/℃, -55℃~+155℃, SMD 1210; Manufacturer: Uniroyal; Manufacturer Part Number: CR1210J750KP05Z; Supplier 1: LCSC; Supplier Part Number 1: C174671; JLCPCB Part Number: C174671; Power Rating: 500mW; Category: Resistors; Package Size: 1210; JLCPCB Basic Part: Yes; Tolerance: ±5%; Voltage Rating: 200V; Temperature Coefficient: ±100ppm/℃; Temperature Rating: -55℃~+155℃; ComponentLink1Description: Datasheet; ComponentLink1URL: https://wmsc.lcsc.com/wmsc/upload/file/pdf/v2/lcsc/2304140030_Ever-Ohms-Tech-CR1210J750KP05Z_C174671.pdf; ComponentLink2Description: JLCPCB Part URL; ComponentLink2URL: https://jlcpcb.com/partdetail/C174671
pins: 1, 2
1 alternate drawing of the same symbol

## CR1210J820KP05
designator R?  Resistance: 820kΩ  (hidden comment: *)
Resistor, 820kΩ, ±5%, 500mW, 200V, ±200ppm/℃, -55℃~+155℃, SMD 1210; Manufacturer: Uniroyal; Manufacturer Part Number: CR1210J820KP05; Supplier 1: LCSC; Supplier Part Number 1: C429369; JLCPCB Part Number: C429369; Power Rating: 500mW; Category: Resistors; Package Size: 1210; JLCPCB Basic Part: Yes; Tolerance: ±5%; Voltage Rating: 200V; Temperature Coefficient: ±200ppm/℃; Temperature Rating: -55℃~+155℃; ComponentLink1Description: Datasheet; ComponentLink1URL: https://wmsc.lcsc.com/wmsc/upload/file/pdf/v2/lcsc/2304140030_Ever-Ohms-Tech-CR1210J820KP05_C429369.pdf; ComponentLink2Description: JLCPCB Part URL; ComponentLink2URL: https://jlcpcb.com/partdetail/C429369
pins: 1, 2
1 alternate drawing of the same symbol

## CR1210J820RP05Z
designator R?  Resistance: 820Ω  (hidden comment: *)
Resistor, 820Ω, ±5%, 500mW, 200V, ±100ppm/℃, -55℃~+155℃, SMD 1210; Manufacturer: Uniroyal; Manufacturer Part Number: CR1210J820RP05Z; Supplier 1: LCSC; Supplier Part Number 1: C174623; JLCPCB Part Number: C174623; Power Rating: 500mW; Category: Resistors; Package Size: 1210; JLCPCB Basic Part: Yes; Tolerance: ±5%; Voltage Rating: 200V; Temperature Coefficient: ±100ppm/℃; Temperature Rating: -55℃~+155℃; ComponentLink1Description: Datasheet; ComponentLink1URL: https://wmsc.lcsc.com/wmsc/upload/file/pdf/v2/lcsc/2304140030_Ever-Ohms-Tech-CR1210J820RP05Z_C174623.pdf; ComponentLink2Description: JLCPCB Part URL; ComponentLink2URL: https://jlcpcb.com/partdetail/C174623
pins: 1, 2
1 alternate drawing of the same symbol

## CR1210J910RP05Z
designator R?  Resistance: 910Ω  (hidden comment: *)
Resistor, 910Ω, ±5%, 500mW, 200V, ±100ppm/℃, -55℃~+155℃, SMD 1210; Manufacturer: Uniroyal; Manufacturer Part Number: CR1210J910RP05Z; Supplier 1: LCSC; Supplier Part Number 1: C174624; JLCPCB Part Number: C174624; Power Rating: 500mW; Category: Resistors; Package Size: 1210; JLCPCB Basic Part: Yes; Tolerance: ±5%; Voltage Rating: 200V; Temperature Coefficient: ±100ppm/℃; Temperature Rating: -55℃~+155℃; ComponentLink1Description: Datasheet; ComponentLink1URL: https://wmsc.lcsc.com/wmsc/upload/file/pdf/v2/lcsc/2304140030_Ever-Ohms-Tech-CR1210J910RP05Z_C174624.pdf; ComponentLink2Description: JLCPCB Part URL; ComponentLink2URL: https://jlcpcb.com/partdetail/C174624
pins: 1, 2
1 alternate drawing of the same symbol

## CR1210J30100G
designator R?  Resistance: 10Ω  (hidden comment: *)
Resistor, 10Ω, ±5%, 750mW, 200V, ±200ppm/℃, -55℃~+125℃, SMD 1210; Manufacturer: Uniroyal; Manufacturer Part Number: CR1210J30100G; Supplier 1: LCSC; Supplier Part Number 1: C102398; JLCPCB Part Number: C102398; Power Rating: 750mW; Category: Resistors; Package Size: 1210; JLCPCB Basic Part: Yes; Tolerance: ±5%; Voltage Rating: 200V; Temperature Coefficient: ±200ppm/℃; Temperature Rating: -55℃~+125℃; ComponentLink1Description: Datasheet; ComponentLink1URL: https://wmsc.lcsc.com/wmsc/upload/file/pdf/v2/lcsc/2304140030_LIZ-Elec-CR1210J30100G_C102398.pdf; ComponentLink2Description: JLCPCB Part URL; ComponentLink2URL: https://jlcpcb.com/partdetail/C102398
pins: 1, 2
1 alternate drawing of the same symbol

## CR1210J30101G
designator R?  Resistance: 100Ω  (hidden comment: *)
Resistor, 100Ω, ±5%, 750mW, 200V, ±200ppm/℃, -55℃~+125℃, SMD 1210; Manufacturer: Uniroyal; Manufacturer Part Number: CR1210J30101G; Supplier 1: LCSC; Supplier Part Number 1: C102399; JLCPCB Part Number: C102399; Power Rating: 750mW; Category: Resistors; Package Size: 1210; JLCPCB Basic Part: Yes; Tolerance: ±5%; Voltage Rating: 200V; Temperature Coefficient: ±200ppm/℃; Temperature Rating: -55℃~+125℃; ComponentLink1Description: Datasheet; ComponentLink1URL: https://wmsc.lcsc.com/wmsc/upload/file/pdf/v2/lcsc/2304140030_LIZ-Elec-CR1210J30101G_C102399.pdf; ComponentLink2Description: JLCPCB Part URL; ComponentLink2URL: https://jlcpcb.com/partdetail/C102399
pins: 1, 2
1 alternate drawing of the same symbol
